# Altium footprint library 6-Connectors-1.PcbLib: 54 footprints (part 5 of 5)
Each footprint in its own frame and in the unit in brackets; x right, y up, seen from the top. Pads: shape width x height; smd on the part's side, far side on the other; paste and mask are expansions set on the pad; w line width, h text height; cw(c..) or ccw(c..) is an arc to the next point about the centre after c.
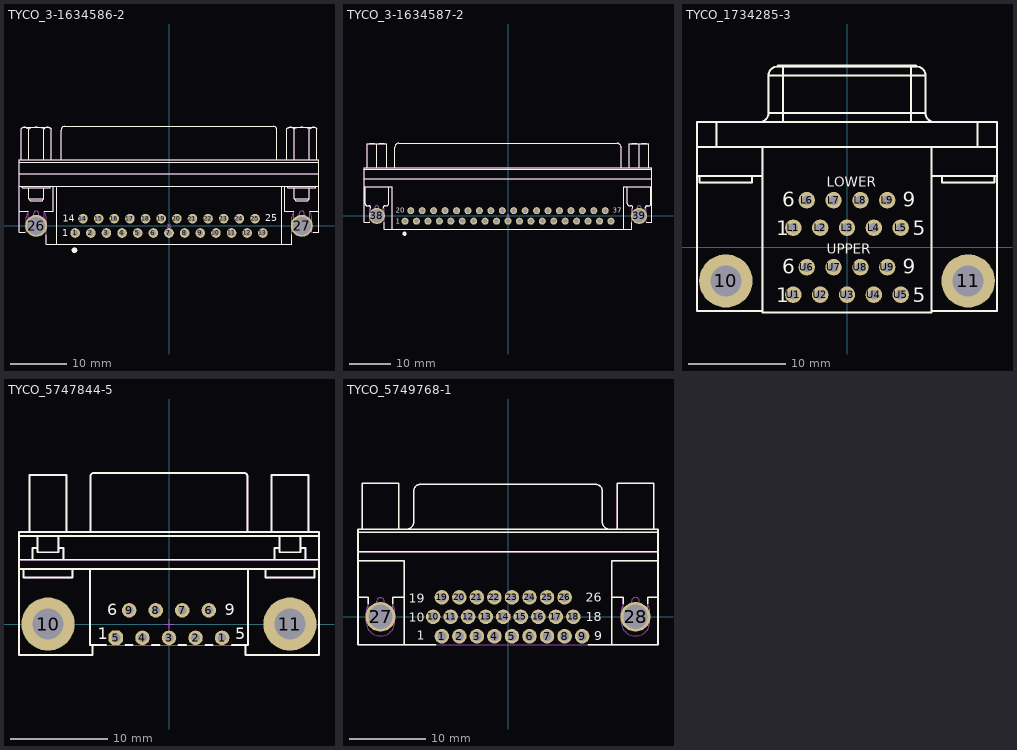
[diagram p4: the footprints below, top view; thin cyan lines are the x and y axes]

## TYCO_3-1634586-2 [mm] "Right Angle 25 Female Contacts D-SUB Connector With Boardlock and 4-40 UNC Screwlocks"
height 13.575
pads (27):
  round 1.7 hole 1: 1(-16.62,-1.27) 2(-13.85,-1.27) 3(-11.08,-1.27) 4(-8.31,-1.27) 5(-5.54,-1.27) 6(-2.77,-1.27) 7(0,-1.27) 8(2.77,-1.27) 9(5.54,-1.27) 10(8.31,-1.27) 11(11.08,-1.27) 12(13.85,-1.27) 13(16.62,-1.27) 14(-15.235,1.27) 15(-12.465,1.27) 16(-9.695,1.27) 17(-6.925,1.27) 18(-4.155,1.27) 19(-1.385,1.27) 20(1.385,1.27) 21(4.155,1.27) 22(6.925,1.27) 23(9.695,1.27) 24(12.465,1.27) 25(15.235,1.27)
  round 3.9 hole 3.2: 26(-23.52,0) 27(23.52,0)
Top Overlay:
  circle w0.5: c-16.745,-4.305 r0.25
  lines w0.2: -26.55,2.62 -24.91,2.62 ; -26.55,7.01 26.55,7.01 ; -26.55,11.23 26.55,11.23 ; -26.508,9.2 26.55,9.2 ; -26.17,11.7 -26.17,17.15 -25.87,17.45 -21.17,17.45 -20.872,17.15 ; -26.168,17.15 cw(c-25.478,16.518) -25.555,17.45 cw(c-25.632,16.518) -24.943,17.15 -24.745,17.15 cw(c-23.52,14.717) -22.295,17.15 -22.097,17.15 cw(c-21.408,16.518) -21.485,17.45 cw(c-21.562,16.518) -20.872,17.15 ; -26.02,7.01 -26.02,6.76 -21.02,6.76 -21.02,7.01 ; -25.569,-1.15 -26.55,-1.15 -26.55,11.7 26.55,11.7 26.55,-1.15 25.569,-1.15 ; -24.86,6.76 -24.86,4.76 ; -24.845,11.7 -24.845,17.15 ; -22.195,11.7 -22.195,17.15 ; -22.18,6.76 -22.18,4.76 ; -22.13,2.62 -20.49,2.62 -20.49,7.01 ; -21.76,-1.557 -21.76,-3.28 21.76,-3.28 21.76,-1.557 ; -20.872,11.7 -20.872,17.15 ; -19.89,-3.28 -19.89,7.01 ; -19.11,11.7 -19.11,16.93 cw(c-18.445,16.935) -18.45,17.6 18.45,17.6 cw(c18.445,16.935) 19.11,16.93 19.11,11.7 ; 19.93,-3.28 19.93,7.01 ; 20.49,7.01 20.49,2.62 22.13,2.62 ; 20.87,11.7 20.87,17.15 21.17,17.45 25.87,17.45 26.168,17.15 ; 20.872,17.15 cw(c21.562,16.518) 21.485,17.45 cw(c21.408,16.518) 22.097,17.15 22.295,17.15 cw(c23.52,14.717) 24.745,17.15 24.943,17.15 cw(c25.632,16.518) 25.555,17.45 cw(c25.478,16.518) 26.168,17.15 ; 21.02,7.01 21.02,6.76 26.02,6.76 26.02,7.01 ; 22.18,6.76 22.18,4.76 ; 22.195,11.7 22.195,17.15 ; 24.845,11.7 24.845,17.15 ; 24.86,6.76 24.86,4.76 ; 24.91,2.62 26.55,2.62 ; 26.168,11.7 26.168,17.15 ; -24.86,4.76 -22.18,4.76 ; -24.86,4.76 -24.56,4.46 -22.48,4.46 -22.18,4.76 ; 22.18,4.76 24.86,4.76 ; 22.18,4.76 22.48,4.46 24.56,4.46 24.86,4.76
  text "25" at 17.04,0.77 h1.2
  text "14" at -18.86,0.72 h1.2
  text "1" at -18.885,-1.88 h1.2
Mechanical 8:
  lines w0.1: -24.02,0 -23.52,0 ; -23.52,-0.5 -23.52,0 ; -23.52,0.5 -23.52,0 ; -23.02,0 -23.52,0 ; -17.12,-1.27 -16.62,-1.27 ; -16.62,-1.77 -16.62,-1.27 ; -16.62,-0.77 -16.62,-1.27 ; -16.12,-1.27 -16.62,-1.27 ; -15.735,1.27 -15.235,1.27 ; -15.235,0.77 -15.235,1.27 ; -15.235,1.77 -15.235,1.27 ; -14.735,1.27 -15.235,1.27 ; -14.35,-1.27 -13.85,-1.27 ; -13.85,-1.77 -13.85,-1.27 ; -13.85,-0.77 -13.85,-1.27 ; -13.35,-1.27 -13.85,-1.27 ; -12.965,1.27 -12.465,1.27 ; -12.465,0.77 -12.465,1.27 ; -12.465,1.77 -12.465,1.27 ; -11.965,1.27 -12.465,1.27 ; -11.58,-1.27 -11.08,-1.27 ; -11.08,-1.77 -11.08,-1.27 ; -11.08,-0.77 -11.08,-1.27 ; -10.58,-1.27 -11.08,-1.27 ; -10.195,1.27 -9.695,1.27 ; -9.695,0.77 -9.695,1.27 ; -9.695,1.77 -9.695,1.27 ; -9.195,1.27 -9.695,1.27 ; -8.81,-1.27 -8.31,-1.27 ; -8.31,-1.77 -8.31,-1.27 ; -8.31,-0.77 -8.31,-1.27 ; -7.81,-1.27 -8.31,-1.27 ; -7.425,1.27 -6.925,1.27 ; -6.925,0.77 -6.925,1.27 ; -6.925,1.77 -6.925,1.27 ; -6.425,1.27 -6.925,1.27 ; -6.04,-1.27 -5.54,-1.27 ; -5.54,-1.77 -5.54,-1.27 ; -5.54,-0.77 -5.54,-1.27 ; -5.04,-1.27 -5.54,-1.27 ; -4.655,1.27 -4.155,1.27 ; -4.155,0.77 -4.155,1.27 ; -4.155,1.77 -4.155,1.27 ; -3.655,1.27 -4.155,1.27 ; -3.27,-1.27 -2.77,-1.27 ; -2.77,-1.77 -2.77,-1.27 ; -2.77,-0.77 -2.77,-1.27 ; -2.27,-1.27 -2.77,-1.27 ; -1.885,1.27 -1.385,1.27 ; -1.385,0.77 -1.385,1.27 ; -1.385,1.77 -1.385,1.27 ; -0.885,1.27 -1.385,1.27 ; -0.5,-1.27 0,-1.27 ; -0.354,-0.354 0,0 ; -0.354,0.354 0,0 ; 0,-1.77 0,-1.27 ; 0,-0.77 0,-1.27 ; 0.354,-0.354 0,0 ; 0.354,0.354 0,0 ; 0.5,-1.27 0,-1.27 ; 0.885,1.27 1.385,1.27 ; 1.385,0.77 1.385,1.27 ; 1.385,1.77 1.385,1.27 ; 1.885,1.27 1.385,1.27 ; 2.27,-1.27 2.77,-1.27 ; 2.77,-1.77 2.77,-1.27 ; 2.77,-0.77 2.77,-1.27 ; 3.27,-1.27 2.77,-1.27 ; 3.655,1.27 4.155,1.27 ; 4.155,0.77 4.155,1.27 ; 4.155,1.77 4.155,1.27 ; 4.655,1.27 4.155,1.27 ; 5.04,-1.27 5.54,-1.27 ; 5.54,-1.77 5.54,-1.27 ; 5.54,-0.77 5.54,-1.27 ; 6.04,-1.27 5.54,-1.27 ; 6.425,1.27 6.925,1.27 ; 6.925,0.77 6.925,1.27 ; 6.925,1.77 6.925,1.27 ; 7.425,1.27 6.925,1.27 ; 7.81,-1.27 8.31,-1.27 ; 8.31,-1.77 8.31,-1.27 ; 8.31,-0.77 8.31,-1.27 ; 8.81,-1.27 8.31,-1.27 ; 9.195,1.27 9.695,1.27 ; 9.695,0.77 9.695,1.27 ; 9.695,1.77 9.695,1.27 ; 10.195,1.27 9.695,1.27 ; 10.58,-1.27 11.08,-1.27 ; 11.08,-1.77 11.08,-1.27 ; 11.08,-0.77 11.08,-1.27 ; 11.58,-1.27 11.08,-1.27 ; 11.965,1.27 12.465,1.27 ; 12.465,0.77 12.465,1.27 ; 12.465,1.77 12.465,1.27 ; 12.965,1.27 12.465,1.27 ; 13.35,-1.27 13.85,-1.27 ; 13.85,-1.77 13.85,-1.27 ; 13.85,-0.77 13.85,-1.27 ; 14.35,-1.27 13.85,-1.27 ; 14.735,1.27 15.235,1.27 ; 15.235,0.77 15.235,1.27 ; 15.235,1.77 15.235,1.27 ; 15.735,1.27 15.235,1.27 ; 16.12,-1.27 16.62,-1.27 ; 16.62,-1.77 16.62,-1.27 ; 16.62,-0.77 16.62,-1.27 ; 17.12,-1.27 16.62,-1.27 ; 23.02,0 23.52,0 ; 23.52,-0.5 23.52,0 ; 23.52,0.5 23.52,0 ; 24.02,0 23.52,0
Mechanical 14:
  lines w0.1: -26.55,2.62 -24.91,2.62 -24.91,-0.318 -23.97,-0.32 -23.97,2.17 cw(c-23.52,2.17) -23.07,2.17 -23.07,-0.316 -22.13,-0.32 -22.13,2.62 -20.49,2.62 -20.49,7.01 ; -26.55,7.01 26.55,7.01 ; -26.55,11.23 26.55,11.23 ; -26.508,9.2 26.55,9.2 ; -26.17,11.7 -26.17,17.15 -25.87,17.45 -21.17,17.45 -20.872,17.15 ; -26.168,17.15 cw(c-25.478,16.518) -25.555,17.45 cw(c-25.632,16.518) -24.943,17.15 -24.745,17.15 cw(c-23.52,14.717) -22.295,17.15 -22.097,17.15 cw(c-21.408,16.518) -21.485,17.45 cw(c-21.562,16.518) -20.872,17.15 ; -26.02,7.01 -26.02,6.76 -21.02,6.76 -21.02,7.01 ; -24.91,2.6 ccw(c-23.52,1.52) -25.28,1.52 -25.28,-1.15 -26.55,-1.15 -26.55,11.7 26.55,11.7 26.55,-1.15 25.28,-1.15 25.28,1.52 ccw(c23.52,1.52) 24.91,2.6 ; -24.86,6.76 -24.86,4.76 ; -24.845,11.7 -24.845,17.15 ; -22.195,11.7 -22.195,17.15 ; -22.18,6.76 -22.18,4.76 ; -22.13,2.6 cw(c-23.52,1.52) -21.76,1.52 -21.76,-3.28 21.76,-3.28 21.76,1.52 cw(c23.52,1.52) 22.13,2.6 ; -20.872,11.7 -20.872,17.15 ; -19.89,-3.28 -19.89,7.01 ; -19.11,11.7 -19.11,16.93 cw(c-18.445,16.935) -18.45,17.6 18.45,17.6 cw(c18.445,16.935) 19.11,16.93 19.11,11.7 ; 19.93,-3.28 19.93,7.01 ; 20.49,7.01 20.49,2.62 22.13,2.62 22.13,-0.32 23.07,-0.32 23.07,2.17 cw(c23.52,2.17) 23.97,2.17 23.97,-0.32 24.91,-0.32 24.91,2.62 26.55,2.62 ; 20.87,11.7 20.87,17.15 21.17,17.45 25.87,17.45 26.168,17.15 ; 20.872,17.15 cw(c21.562,16.518) 21.485,17.45 cw(c21.408,16.518) 22.097,17.15 22.295,17.15 cw(c23.52,14.717) 24.745,17.15 24.943,17.15 cw(c25.632,16.518) 25.555,17.45 cw(c25.478,16.518) 26.168,17.15 ; 21.02,7.01 21.02,6.76 26.02,6.76 26.02,7.01 ; 22.18,6.76 22.18,4.76 ; 22.195,11.7 22.195,17.15 ; 24.845,11.7 24.845,17.15 ; 24.86,6.76 24.86,4.76 ; 26.168,11.7 26.168,17.15 ; -24.86,4.76 -22.18,4.76 ; -24.86,4.76 -24.56,4.46 -22.48,4.46 -22.18,4.76 ; 22.18,4.76 24.86,4.76 ; 22.18,4.76 22.48,4.46 24.56,4.46 24.86,4.76
  text "25" at 17.04,0.77 h1.2
  text "14" at -18.86,0.72 h1.2
  text "1" at -18.885,-1.88 h1.2
3D body "TYCO_3-1634586-2.stp": height 13.57, standoff -3.77, extent -26.55,-3.28 26.55,17.6

## TYCO_3-1634587-2 [mm] "Right Angle 37 Female Contacts D-SUB Connector With Boardlock and 4-40 UNC Screwlocks"
height 13.57
pads (39):
  round 1.7 hole 1: 1(-24.93,-1.27) 2(-22.16,-1.27) 3(-19.39,-1.27) 4(-16.62,-1.27) 5(-13.85,-1.27) 6(-11.08,-1.27) 7(-8.31,-1.27) 8(-5.54,-1.27) 9(-2.77,-1.27) 10(0,-1.27) 11(2.77,-1.27) 12(5.54,-1.27) 13(8.31,-1.27) 14(11.08,-1.27) 15(13.85,-1.27) 16(16.62,-1.27) 17(19.39,-1.27) 18(22.16,-1.27) 19(24.93,-1.27) 20(-23.545,1.27) 21(-20.775,1.27) 22(-18.005,1.27) 23(-15.235,1.27) 24(-12.465,1.27) 25(-9.695,1.27) 26(-6.925,1.27) 27(-4.155,1.27) 28(-1.385,1.27) 29(1.385,1.27) 30(4.155,1.27) 31(6.925,1.27) 32(9.695,1.27) 33(12.465,1.27) 34(15.235,1.27) 35(18.005,1.27) 36(20.775,1.27) 37(23.545,1.27)
  round 3.9 hole 3.2: 38(-31.75,0) 39(31.75,0)
Top Overlay:
  circle w0.5: c-25.055,-4.305 r0.25
  lines w0.2: -34.75,7.12 -28,7.12 -28,-3.28 ; -34.75,9.02 34.75,9.02 ; -34.75,11.33 -34.75,11.7 ; -34.726,11.33 34.75,11.33 ; -34.6,7.12 -34.6,2.97 ccw(c-34.1,2.97) -34.1,2.47 -33.75,2.47 cw(c-33.75,1.97) -33.25,1.97 -33.25,1.809 ; -34.1,11.7 -34.1,17.5 -29.4,17.5 -29.4,11.7 ; -34.1,17.284 cw(c-32.925,14.1) -31.75,17.284 ; -33.5,-1.48 -34.75,-1.48 -34.75,11.7 ; -31.75,11.7 -31.75,17.284 ; -30.25,1.809 -30.25,1.97 cw(c-29.75,1.97) -29.75,2.47 -29.4,2.47 ccw(c-29.4,2.97) -28.9,2.97 -28.9,7.12 ; -30,-1.568 -30,-3.28 30,-3.28 30,-1.568 ; -29.4,17.284 ccw(c-30.575,14.1) -31.75,17.284 ; -27.4,11.7 -27.4,16.6 cw(c-26.4,16.6) -26.4,17.6 26.4,17.6 cw(c26.4,16.6) 27.4,16.6 27.4,11.7 ; 28,-3.28 28,7.12 34.75,7.12 ; 28.9,7.12 28.9,2.97 ccw(c29.4,2.97) 29.4,2.47 29.75,2.47 cw(c29.75,1.97) 30.25,1.97 30.25,1.809 ; 29.4,11.7 29.4,17.5 34.1,17.5 34.1,11.7 ; 29.4,17.284 cw(c30.575,14.1) 31.75,17.284 ; 31.75,11.7 31.75,17.284 ; 33.25,1.809 33.25,1.97 cw(c33.75,1.97) 33.75,2.47 34.1,2.47 ccw(c34.1,2.97) 34.6,2.97 34.6,7.12 ; 33.5,-1.48 34.75,-1.48 34.75,11.7 -34.75,11.7 ; 34.1,17.284 ccw(c32.925,14.1) 31.75,17.284
  text "37" at 25.35,0.77 h1.2
  text "1" at -27.195,-1.88 h1.2
  text "20" at -27.17,0.72 h1.2
Mechanical 8:
  drawing of 160 lines, arcs and shapes, not listed
Mechanical 14:
  lines w0.1: -34.75,7.12 -28,7.12 -28,-3.28 ; -34.75,9.02 34.75,9.02 ; -34.75,11.33 -34.75,11.7 ; -34.726,11.33 34.75,11.33 ; -34.6,7.12 -34.6,2.97 ccw(c-34.1,2.97) -34.1,2.47 -33.75,2.47 cw(c-33.75,1.97) -33.25,1.97 -33.25,-0.305 -32.25,-0.305 -32.25,1.97 cw(c-31.75,1.97) -31.25,1.97 -31.25,-0.305 -30.25,-0.305 -30.25,1.97 cw(c-29.75,1.97) -29.75,2.47 -29.4,2.47 ccw(c-29.4,2.97) -28.9,2.97 -28.9,7.12 ; -34.1,11.7 -34.1,17.5 -29.4,17.5 -29.4,11.7 ; -34.1,17.284 cw(c-32.925,14.1) -31.75,17.284 ; -33.383,2.309 ccw(c-31.75,1.68) -33.5,1.68 -33.5,-1.48 -34.75,-1.48 -34.75,11.7 ; -31.75,11.7 -31.75,17.284 ; -30.117,2.309 cw(c-31.75,1.68) -30,1.68 -30,-3.28 30,-3.28 30,1.68 cw(c31.75,1.68) 30.117,2.309 ; -29.4,17.284 ccw(c-30.575,14.1) -31.75,17.284 ; -27.4,11.7 -27.4,16.6 cw(c-26.4,16.6) -26.4,17.6 26.4,17.6 cw(c26.4,16.6) 27.4,16.6 27.4,11.7 ; 28,-3.28 28,7.12 34.75,7.12 ; 28.9,7.12 28.9,2.97 ccw(c29.4,2.97) 29.4,2.47 29.75,2.47 cw(c29.75,1.97) 30.25,1.97 30.25,-0.305 31.25,-0.305 31.25,1.97 cw(c31.75,1.97) 32.25,1.97 32.25,-0.305 33.25,-0.305 33.25,1.97 cw(c33.75,1.97) 33.75,2.47 34.1,2.47 ccw(c34.1,2.97) 34.6,2.97 34.6,7.12 ; 29.4,11.7 29.4,17.5 34.1,17.5 34.1,11.7 ; 29.4,17.284 cw(c30.575,14.1) 31.75,17.284 ; 31.75,11.7 31.75,17.284 ; 33.383,2.309 cw(c31.75,1.68) 33.5,1.68 33.5,-1.48 34.75,-1.48 34.75,11.7 -34.75,11.7 ; 34.1,17.284 ccw(c32.925,14.1) 31.75,17.284
  text "37" at 25.35,0.77 h1.2
  text "1" at -27.195,-1.88 h1.2
  text "20" at -27.17,0.72 h1.2
3D body "TYCO_3-1634587-2.stp": height 13.57, standoff -3.8, extent -34.75,-3.28 34.75,17.6

## TYCO_1734285-3 [mm] "Dual Stacked  Right Angled D-SUB 9 Pins Female Connector, With Threaded Insert UNC 4-40, And PCB Mount Retention"
height 31.9
pads (20):
  round 5.5 hole 3.2: 10(-12.495,-3.455) 11(12.495,-3.455)
  round 1.7 hole 1: L1(-5.54,2.035) L2(-2.77,2.035) L3(0,2.035) L4(2.77,2.035) L5(5.54,2.035) L6(-4.155,4.875) L7(-1.385,4.875) L8(1.385,4.875) L9(4.155,4.875) U1(-5.54,-4.875) U2(-2.77,-4.875) U3(0,-4.875) U4(2.77,-4.875) U5(5.54,-4.875) U6(-4.155,-2.035) U7(-1.385,-2.035) U8(1.385,-2.035) U9(4.155,-2.035)
Top Overlay:
  lines w0.2: -15.475,7.355 -8.725,7.355 ; -15.475,10.355 15.475,10.355 ; -15.195,7.355 -15.195,6.691 -9.795,6.691 -9.795,7.355 ; -13.475,10.355 -13.475,12.955 ; -9,12.955 ccw(c-9,13.855) -8.1,13.855 ; -8.725,-6.545 -15.475,-6.545 -15.475,12.955 15.475,12.955 15.475,-6.545 8.725,-6.545 ; -8.725,10.355 -8.725,-6.695 8.725,-6.695 8.725,10.355 ; -7.1,18.655 -7.1,18.755 7.1,18.755 7.1,18.655 ; -6.6,12.955 -6.6,18.755 ; 6.6,12.955 6.6,18.755 ; 8.725,7.355 15.475,7.355 ; 9,12.955 cw(c9,13.855) 8.1,13.855 ; 9.795,7.355 9.795,6.691 15.195,6.691 15.195,7.355 ; 13.475,10.355 13.475,12.955 ; -8.1,13.855 8.1,13.855 ; -8.1,13.855 -8.1,17.755 ; -8.1,17.755 cw(c-7.2,17.755) -7.2,18.655 7.199,18.655 cw(c7.2,17.755) 8.1,17.755 ; -8.1,17.755 8.1,17.755 ; 8.1,13.855 8.1,17.755
  text "1" at -7.299,-5.637 h1.5
  text "6" at -6.661,-2.722 h1.5
  text "6" at -6.661,4.188 h1.5
  text "1" at -7.299,1.273 h1.5
  text "UPPER" at -2.1,-0.65 h1
  text "LOWER" at -2.1,6.26 h1
  text "9" at 5.726,-2.722 h1.5
  text "5" at 6.791,-5.637 h1.5
  text "5" at 6.791,1.273 h1.5
  text "9" at 5.726,4.188 h1.5
Mechanical 7:
  lines w0.1: -12.995,-3.455 -12.495,-3.455 ; -12.495,-3.955 -12.495,-3.455 ; -12.495,-2.955 -12.495,-3.455 ; -11.995,-3.455 -12.495,-3.455 ; 11.995,-3.455 12.495,-3.455 ; 12.495,-3.955 12.495,-3.455 ; 12.495,-2.955 12.495,-3.455 ; 12.995,-3.455 12.495,-3.455
Mechanical 8:
  lines w0.1: -6.04,-4.875 -5.54,-4.875 ; -6.04,2.035 -5.54,2.035 ; -5.54,-5.375 -5.54,-4.875 ; -5.54,-4.375 -5.54,-4.875 ; -5.54,1.535 -5.54,2.035 ; -5.54,2.535 -5.54,2.035 ; -5.04,-4.875 -5.54,-4.875 ; -5.04,2.035 -5.54,2.035 ; -4.655,-2.035 -4.155,-2.035 ; -4.655,4.875 -4.155,4.875 ; -4.155,-2.535 -4.155,-2.035 ; -4.155,-1.535 -4.155,-2.035 ; -4.155,4.375 -4.155,4.875 ; -4.155,5.375 -4.155,4.875 ; -3.655,-2.035 -4.155,-2.035 ; -3.655,4.875 -4.155,4.875 ; -3.27,-4.875 -2.77,-4.875 ; -3.27,2.035 -2.77,2.035 ; -2.77,-5.375 -2.77,-4.875 ; -2.77,-4.375 -2.77,-4.875 ; -2.77,1.535 -2.77,2.035 ; -2.77,2.535 -2.77,2.035 ; -2.27,-4.875 -2.77,-4.875 ; -2.27,2.035 -2.77,2.035 ; -1.885,-2.035 -1.385,-2.035 ; -1.885,4.875 -1.385,4.875 ; -1.385,-2.535 -1.385,-2.035 ; -1.385,-1.535 -1.385,-2.035 ; -1.385,4.375 -1.385,4.875 ; -1.385,5.375 -1.385,4.875 ; -0.885,-2.035 -1.385,-2.035 ; -0.885,4.875 -1.385,4.875 ; -0.5,-4.875 0,-4.875 ; -0.5,0 0,0 ; -0.5,2.035 0,2.035 ; 0,-5.375 0,-4.875 ; 0,-4.375 0,-4.875 ; 0,-0.5 0,0 ; 0,0.5 0,0 ; 0,1.535 0,2.035 ; 0,2.535 0,2.035 ; 0.5,-4.875 0,-4.875 ; 0.5,0 0,0 ; 0.5,2.035 0,2.035 ; 0.885,-2.035 1.385,-2.035 ; 0.885,4.875 1.385,4.875 ; 1.385,-2.535 1.385,-2.035 ; 1.385,-1.535 1.385,-2.035 ; 1.385,4.375 1.385,4.875 ; 1.385,5.375 1.385,4.875 ; 1.885,-2.035 1.385,-2.035 ; 1.885,4.875 1.385,4.875 ; 2.27,-4.875 2.77,-4.875 ; 2.27,2.035 2.77,2.035 ; 2.77,-5.375 2.77,-4.875 ; 2.77,-4.375 2.77,-4.875 ; 2.77,1.535 2.77,2.035 ; 2.77,2.535 2.77,2.035 ; 3.27,-4.875 2.77,-4.875 ; 3.27,2.035 2.77,2.035 ; 3.655,-2.035 4.155,-2.035 ; 3.655,4.875 4.155,4.875 ; 4.155,-2.535 4.155,-2.035 ; 4.155,-1.535 4.155,-2.035 ; 4.155,4.375 4.155,4.875 ; 4.155,5.375 4.155,4.875 ; 4.655,-2.035 4.155,-2.035 ; 4.655,4.875 4.155,4.875 ; 5.04,-4.875 5.54,-4.875 ; 5.04,2.035 5.54,2.035 ; 5.54,-5.375 5.54,-4.875 ; 5.54,-4.375 5.54,-4.875 ; 5.54,1.535 5.54,2.035 ; 5.54,2.535 5.54,2.035 ; 6.04,-4.875 5.54,-4.875 ; 6.04,2.035 5.54,2.035
Mechanical 14:
  drawing of 6657 lines, arcs and shapes, not listed
  text "9" at 5.726,4.188 h1.5
  text "5" at 6.791,1.273 h1.5
  text "5" at 6.791,-5.637 h1.5
  text "9" at 5.726,-2.722 h1.5
  text "1" at -7.299,1.273 h1.5
  text "6" at -6.661,4.188 h1.5
  text "6" at -6.661,-2.722 h1.5
  text "1" at -7.299,-5.637 h1.5
  text "UPPER" at -2.1,-0.65 h1
  text "LOWER" at -2.1,6.26 h1
3D body "TYCO_1734285-3.stp": height 31.6, standoff -3.55, extent -15.475,-6.695 15.475,18.805

## TYCO_5747844-5 [mm] "Right Angle 9 Female Contacts D-SUB Connector With PCB Mount Retention , Grounding Straps, and Fixed UNC 4-40 Female Screwlocks"
height 12.92
pads (11):
  round 1.5 hole 0.9: 1(5.48,-1.422) 2(2.74,-1.422) 3(0,-1.422) 4(-2.74,-1.422) 6(4.11,1.422) 7(1.37,1.422) 8(-1.37,1.422) 9(-4.11,1.422)
  oct 1.5x1.5 hole 0.9: 5(-5.48,-1.422)
  round 5.5 hole 3.2 unplated: 10(-12.495,0)
  round 5.5 hole 3.2: 11(12.495,0)
Top Overlay:
  lines w0.2: -15.494,5.679 15.494,5.679 ; -15.494,6.645 15.494,6.645 ; -15.494,9.108 15.494,9.108 ; -15.011,5.679 -15.011,4.79 -9.982,4.79 -9.982,5.679 ; -14.402,9.525 -14.402,15.408 -10.592,15.408 -10.592,9.525 ; -14.084,6.645 -14.084,7.838 -13.576,7.838 ; -13.576,9.108 -13.576,7.422 -11.417,7.422 -11.417,9.108 ; -11.417,7.838 -10.909,7.838 -10.909,6.645 ; -8.153,5.679 -8.153,-2.169 -6.482,-2.169 ; -8.1,9.525 -8.1,15.296 cw(c-7.8,15.296) -7.8,15.596 7.8,15.596 cw(c7.8,15.296) 8.1,15.296 8.1,9.525 ; -7.899,-2.169 -7.899,-3.185 -15.494,-3.185 -15.494,9.525 15.494,9.525 15.494,-3.185 7.899,-3.185 7.899,-2.169 ; -4.478,-2.169 -3.742,-2.169 ; -1.738,-2.169 -1.002,-2.169 ; 1.002,-2.169 1.738,-2.169 ; 3.742,-2.169 4.478,-2.169 ; 6.482,-2.169 8.153,-2.169 8.153,5.679 ; 9.982,5.679 9.982,4.79 15.011,4.79 15.011,5.679 ; 10.592,9.525 10.592,15.408 14.402,15.408 14.402,9.525 ; 10.909,6.645 10.909,7.838 11.417,7.838 ; 11.417,9.108 11.417,7.422 13.576,7.422 13.576,9.108 ; 13.576,7.838 14.084,7.838 14.084,6.645
  text "9" at 5.75,0.925 h1.2
  text "1" at -7.35,-1.575 h1.2
  text "5" at 6.85,-1.575 h1.2
  text "6" at -6.375,0.925 h1.2
Mechanical 8:
  circle w0.1: c-12.495,0 r1.6
  circle w0.1: c12.495,0 r1.6
  circle w0.1: c-4.11,1.422 r0.5
  circle w0.1: c-5.48,-1.422 r0.5
  circle w0.1: c4.11,1.422 r0.5
  circle w0.1: c5.48,-1.422 r0.5
  lines w0.1: -12.995,0 -12.495,0 ; -12.495,-0.5 -12.495,0 ; -12.495,0.5 -12.495,0 ; -11.995,0 -12.495,0 ; -5.98,-1.422 -5.48,-1.422 ; -5.48,-1.922 -5.48,-1.422 ; -5.48,-0.922 -5.48,-1.422 ; -4.98,-1.422 -5.48,-1.422 ; -4.61,1.422 -4.11,1.422 ; -4.11,0.922 -4.11,1.422 ; -4.11,1.922 -4.11,1.422 ; -3.61,1.422 -4.11,1.422 ; -3.24,-1.422 -2.74,-1.422 ; -2.74,-1.922 -2.74,-1.422 ; -2.74,-0.922 -2.74,-1.422 ; -2.24,-1.422 -2.74,-1.422 ; -1.87,1.422 -1.37,1.422 ; -1.37,0.922 -1.37,1.422 ; -1.37,1.922 -1.37,1.422 ; -0.87,1.422 -1.37,1.422 ; -0.5,-1.422 0,-1.422 ; -0.5,0 0,0 ; 0,-1.922 0,-1.422 ; 0,-0.922 0,-1.422 ; 0,-0.5 0,0 ; 0,0.5 0,0 ; 0.5,-1.422 0,-1.422 ; 0.5,0 0,0 ; 0.87,1.422 1.37,1.422 ; 1.37,0.922 1.37,1.422 ; 1.37,1.922 1.37,1.422 ; 1.87,1.422 1.37,1.422 ; 2.24,-1.422 2.74,-1.422 ; 2.74,-1.922 2.74,-1.422 ; 2.74,-0.922 2.74,-1.422 ; 3.24,-1.422 2.74,-1.422 ; 3.61,1.422 4.11,1.422 ; 4.11,0.922 4.11,1.422 ; 4.11,1.922 4.11,1.422 ; 4.61,1.422 4.11,1.422 ; 4.98,-1.422 5.48,-1.422 ; 5.48,-1.922 5.48,-1.422 ; 5.48,-0.922 5.48,-1.422 ; 5.98,-1.422 5.48,-1.422 ; 11.995,0 12.495,0 ; 12.495,-0.5 12.495,0 ; 12.495,0.5 12.495,0 ; 12.995,0 12.495,0
Mechanical 14:
  circle w0.1: c-12.497,0 r1.854
  circle w0.1: c-12.497,0 r1.549
  circle w0.1: c12.497,0 r1.854
  circle w0.1: c12.497,0 r1.549
  lines w0.1: -15.494,5.679 15.494,5.679 ; -15.494,6.645 15.494,6.645 ; -15.494,9.108 15.494,9.108 ; -15.011,5.679 -15.011,4.79 -9.982,4.79 -9.982,5.679 ; -14.402,9.525 -14.402,15.408 -10.592,15.408 -10.592,9.525 ; -14.084,6.645 -14.084,7.838 -13.576,7.838 ; -13.576,9.108 -13.576,7.422 -11.417,7.422 -11.417,9.108 ; -11.417,7.838 -10.909,7.838 -10.909,6.645 ; -8.153,5.679 -8.153,-2.169 8.153,-2.169 8.153,5.679 ; -8.1,9.525 -8.1,15.296 cw(c-7.8,15.296) -7.8,15.596 7.8,15.596 cw(c7.8,15.296) 8.1,15.296 8.1,9.525 ; -7.899,-2.169 -7.899,-3.185 -15.494,-3.185 -15.494,9.525 15.494,9.525 15.494,-3.185 7.899,-3.185 7.899,-2.169 ; 9.982,5.679 9.982,4.79 15.011,4.79 15.011,5.679 ; 10.592,9.525 10.592,15.408 14.402,15.408 14.402,9.525 ; 10.909,6.645 10.909,7.838 11.417,7.838 ; 11.417,9.108 11.417,7.422 13.576,7.422 13.576,9.108 ; 13.576,7.838 14.084,7.838 14.084,6.645
  text "6" at -6.375,0.925 h1.2
  text "5" at 6.85,-1.575 h1.2
  text "1" at -7.35,-1.575 h1.2
  text "9" at 5.75,0.925 h1.2
3D body "rs232-gdvia.stp": height 0.1, standoff -1.82, extent 9.823,-2.75 15.323,2.75
3D body "rs232-gdvia.stp": height 0.1, standoff -1.82, extent -15.196,-2.75 -9.696,2.75
3D body "TYCO_5747844-5.stp": height 12.55, standoff -3.26, extent -15.494,-3.185 15.494,15.71
3D body "m20-254via.stp": height 0.1, standoff -1.82, extent -6.311,-2.247 -4.611,-0.547
3D body "m20-254via.stp": height 0.1, standoff -1.82, extent -4.914,0.547 -3.214,2.247
3D body "m20-254via.stp": height 0.1, standoff -1.82, extent -2.247,0.547 -0.547,2.247
3D body "m20-254via.stp": height 0.1, standoff -1.82, extent 0.547,0.547 2.247,2.247
3D body "m20-254via.stp": height 0.1, standoff -1.82, extent 3.26,0.573 4.96,2.273
3D body "m20-254via.stp": height 0.1, standoff -1.82, extent -0.85,-2.247 0.85,-0.547
3D body "m20-254via.stp": height 0.1, standoff -1.82, extent -3.644,-2.247 -1.944,-0.547
3D body "m20-254via.stp": height 0.1, standoff -1.82, extent 1.944,-2.247 3.644,-0.547
3D body "m20-254via.stp": height 0.1, standoff -1.82, extent 4.611,-2.247 6.311,-0.547

## TYCO_5749768-1 [mm] "26 Female Contacts, Right Angle High Density D-SUB Connector With Boardlock and 4-40 UNC Female Screwlocks, AMPLIMITE HD-22 Serie"
height 12.75
pads (28):
  round 1.9 hole 1.2: 1(-8.64,-2.54) 2(-6.35,-2.54) 3(-4.06,-2.54) 4(-1.77,-2.54) 5(0.52,-2.54) 6(2.81,-2.54) 7(5.1,-2.54) 8(7.39,-2.54) 9(9.68,-2.54) 10(-9.78,0) 11(-7.49,0) 12(-5.2,0) 13(-2.91,0) 14(-0.62,0) 15(1.67,0) 16(3.96,0) 17(6.25,0) 18(8.54,0) 19(-8.64,2.54) 20(-6.35,2.54) 21(-4.06,2.54) 22(-1.77,2.54) 23(0.52,2.54) 24(2.81,2.54) 25(5.1,2.54) 26(7.39,2.54)
  round 3.9 hole 3.2: 27(-16.66,0) 28(16.66,0)
Top Overlay:
  lines w0.2: -19.6,2.53 -18.285,2.53 -18.285,1.698 ; -19.6,7.33 -13.55,7.33 -13.55,-3.63 ; -19.6,8.53 19.6,8.53 ; -19.6,11.03 19.6,11.03 ; -19.06,11.43 -19.06,17.43 -14.26,17.43 -14.26,11.43 ; -15.035,1.698 -15.035,2.53 -13.55,2.53 ; -13.32,11.43 ccw(c-13.32,12.43) -12.32,12.43 -12.32,16.45 cw(c-11.47,16.45) -11.47,17.3 11.47,17.3 cw(c11.47,16.45) 12.32,16.45 12.32,12.43 ccw(c13.32,12.43) 13.32,11.43 ; -9.436,-3.63 -19.6,-3.63 -19.6,11.43 19.6,11.43 19.6,-3.63 10.476,-3.63 ; 13.55,-3.63 13.55,7.33 19.6,7.33 ; 13.55,2.53 15.035,2.53 15.035,1.698 ; 14.26,11.43 14.26,17.43 19.06,17.43 19.06,11.43 ; 18.285,1.698 18.285,2.53 19.6,2.53
  text "1" at -11.95,-3 h1.2
  text "19" at -12.95,1.865 h1.2
  text "10" at -12.95,-0.675 h1.2
  text "18" at 10.175,-0.6 h1.2
  text "26" at 10.175,1.94 h1.2
  text "9" at 11.25,-3.04 h1.2
Mechanical 8:
  lines w0.1: -17.16,0 -16.66,0 ; -16.66,-0.5 -16.66,0 ; -16.66,0.5 -16.66,0 ; -16.16,0 -16.66,0 ; -10.28,0 -9.78,0 ; -9.78,-0.5 -9.78,0 ; -9.78,0.5 -9.78,0 ; -9.28,0 -9.78,0 ; -9.14,-2.54 -8.64,-2.54 ; -9.14,2.54 -8.64,2.54 ; -8.64,-3.04 -8.64,-2.54 ; -8.64,-2.04 -8.64,-2.54 ; -8.64,2.04 -8.64,2.54 ; -8.64,3.04 -8.64,2.54 ; -8.14,-2.54 -8.64,-2.54 ; -8.14,2.54 -8.64,2.54 ; -7.99,0 -7.49,0 ; -7.49,-0.5 -7.49,0 ; -7.49,0.5 -7.49,0 ; -6.99,0 -7.49,0 ; -6.85,-2.54 -6.35,-2.54 ; -6.85,2.54 -6.35,2.54 ; -6.35,-3.04 -6.35,-2.54 ; -6.35,-2.04 -6.35,-2.54 ; -6.35,2.04 -6.35,2.54 ; -6.35,3.04 -6.35,2.54 ; -5.85,-2.54 -6.35,-2.54 ; -5.85,2.54 -6.35,2.54 ; -5.7,0 -5.2,0 ; -5.2,-0.5 -5.2,0 ; -5.2,0.5 -5.2,0 ; -4.7,0 -5.2,0 ; -4.56,-2.54 -4.06,-2.54 ; -4.56,2.54 -4.06,2.54 ; -4.06,-3.04 -4.06,-2.54 ; -4.06,-2.04 -4.06,-2.54 ; -4.06,2.04 -4.06,2.54 ; -4.06,3.04 -4.06,2.54 ; -3.56,-2.54 -4.06,-2.54 ; -3.56,2.54 -4.06,2.54 ; -3.41,0 -2.91,0 ; -2.91,-0.5 -2.91,0 ; -2.91,0.5 -2.91,0 ; -2.41,0 -2.91,0 ; -2.27,-2.54 -1.77,-2.54 ; -2.27,2.54 -1.77,2.54 ; -1.77,-3.04 -1.77,-2.54 ; -1.77,-2.04 -1.77,-2.54 ; -1.77,2.04 -1.77,2.54 ; -1.77,3.04 -1.77,2.54 ; -1.27,-2.54 -1.77,-2.54 ; -1.27,2.54 -1.77,2.54 ; -1.12,0 -0.62,0 ; -0.62,-0.5 -0.62,0 ; -0.62,0.5 -0.62,0 ; -0.354,-0.354 0,0 ; -0.354,0.354 0,0 ; 0.02,-2.54 0.52,-2.54 ; 0.02,2.54 0.52,2.54 ; 0.354,-0.354 0,0 ; 0.354,0.354 0,0 ; 0.52,-3.04 0.52,-2.54 ; 0.52,-2.04 0.52,-2.54 ; 0.52,2.04 0.52,2.54 ; 0.52,3.04 0.52,2.54 ; 1.02,-2.54 0.52,-2.54 ; 1.02,2.54 0.52,2.54 ; 1.17,0 1.67,0 ; 1.67,-0.5 1.67,0 ; 1.67,0.5 1.67,0 ; 2.17,0 1.67,0 ; 2.31,-2.54 2.81,-2.54 ; 2.31,2.54 2.81,2.54 ; 2.81,-3.04 2.81,-2.54 ; 2.81,-2.04 2.81,-2.54 ; 2.81,2.04 2.81,2.54 ; 2.81,3.04 2.81,2.54 ; 3.31,-2.54 2.81,-2.54 ; 3.31,2.54 2.81,2.54 ; 3.46,0 3.96,0 ; 3.96,-0.5 3.96,0 ; 3.96,0.5 3.96,0 ; 4.46,0 3.96,0 ; 4.6,-2.54 5.1,-2.54 ; 4.6,2.54 5.1,2.54 ; 5.1,-3.04 5.1,-2.54 ; 5.1,-2.04 5.1,-2.54 ; 5.1,2.04 5.1,2.54 ; 5.1,3.04 5.1,2.54 ; 5.6,-2.54 5.1,-2.54 ; 5.6,2.54 5.1,2.54 ; 5.75,0 6.25,0 ; 6.25,-0.5 6.25,0 ; 6.25,0.5 6.25,0 ; 6.75,0 6.25,0 ; 6.89,-2.54 7.39,-2.54 ; 6.89,2.54 7.39,2.54 ; 7.39,-3.04 7.39,-2.54 ; 7.39,-2.04 7.39,-2.54 ; 7.39,2.04 7.39,2.54 ; 7.39,3.04 7.39,2.54 ; 7.89,-2.54 7.39,-2.54 ; 7.89,2.54 7.39,2.54 ; 8.04,0 8.54,0 ; 8.54,-0.5 8.54,0 ; 8.54,0.5 8.54,0 ; 9.04,0 8.54,0 ; 9.18,-2.54 9.68,-2.54 ; 9.68,-3.04 9.68,-2.54 ; 9.68,-2.04 9.68,-2.54 ; 10.18,-2.54 9.68,-2.54 ; 16.16,0 16.66,0 ; 16.66,-0.5 16.66,0 ; 16.66,0.5 16.66,0 ; 17.16,0 16.66,0
Mechanical 14:
  lines w0.1: -19.6,2.53 -18.285,2.53 -18.285,-0.3 ; -19.6,7.33 -13.55,7.33 -13.55,-3.63 ; -19.6,8.53 19.6,8.53 ; -19.6,11.03 19.6,11.03 ; -19.06,11.43 -19.06,17.43 -14.26,17.43 -14.26,11.43 ; -18.285,0.3 -18.535,0.3 -18.535,0.625 cw(c-16.66,0.625) -18.285,1.56 ; -17.16,2.03 -17.16,-0.3 -18.285,-0.3 ; -17.154,1.951 cw(c-16.658,2.001) -16.16,2.03 -16.16,-0.3 -15.035,-0.3 ; -15.035,0.3 -14.785,0.3 -14.785,0.625 ccw(c-16.66,0.625) -15.035,1.56 ; -13.55,2.53 -15.035,2.53 -15.035,-0.3 ; -13.32,11.43 ccw(c-13.32,12.43) -12.32,12.43 -12.32,16.45 cw(c-11.47,16.45) -11.47,17.3 11.47,17.3 cw(c11.47,16.45) 12.32,16.45 12.32,12.43 ccw(c13.32,12.43) 13.32,11.43 ; 13.55,-3.63 13.55,7.33 19.6,7.33 ; 13.55,2.53 15.035,2.53 15.035,-0.3 ; 14.26,11.43 14.26,17.43 19.06,17.43 19.06,11.43 ; 15.035,0.3 14.785,0.3 14.785,0.625 cw(c16.66,0.625) 15.035,1.56 ; 18.285,0.3 18.535,0.3 18.535,0.625 ccw(c16.66,0.625) 18.285,1.56 ; 19.6,2.53 18.285,2.53 18.285,-0.3 ; -18.285,-0.3 -18.535,-0.3 -18.535,-0.625 ccw(c-16.66,-0.625) -14.785,-0.625 -14.785,-0.3 -15.035,-0.3 ; 15.035,-0.3 14.785,-0.3 14.785,-0.625 ccw(c16.66,-0.625) 18.535,-0.625 18.535,-0.3 18.285,-0.3 ; 15.035,-0.3 16.16,-0.3 16.16,2.03 cw(c16.66,2.03) 17.16,2.03 17.16,-0.3 18.285,-0.3 ; -19.6,-3.63 -19.6,11.43 19.6,11.43 19.6,-3.63 -19.6,-3.63
3D body "TYCO_5749768-1.stp": height 12.5, standoff -4.35, extent -19.6,-3.63 19.6,17.43